# Altium footprint library LukaLIBRARY.PcbLib: 784 footprints (part 39 of 49)
Each footprint in its own frame and in the unit in brackets; x right, y up, seen from the top. Pads: shape width x height; smd on the part's side, far side on the other; paste and mask are expansions set on the pad; w line width, h text height; cw(c..) or ccw(c..) is an arc to the next point about the centre after c.
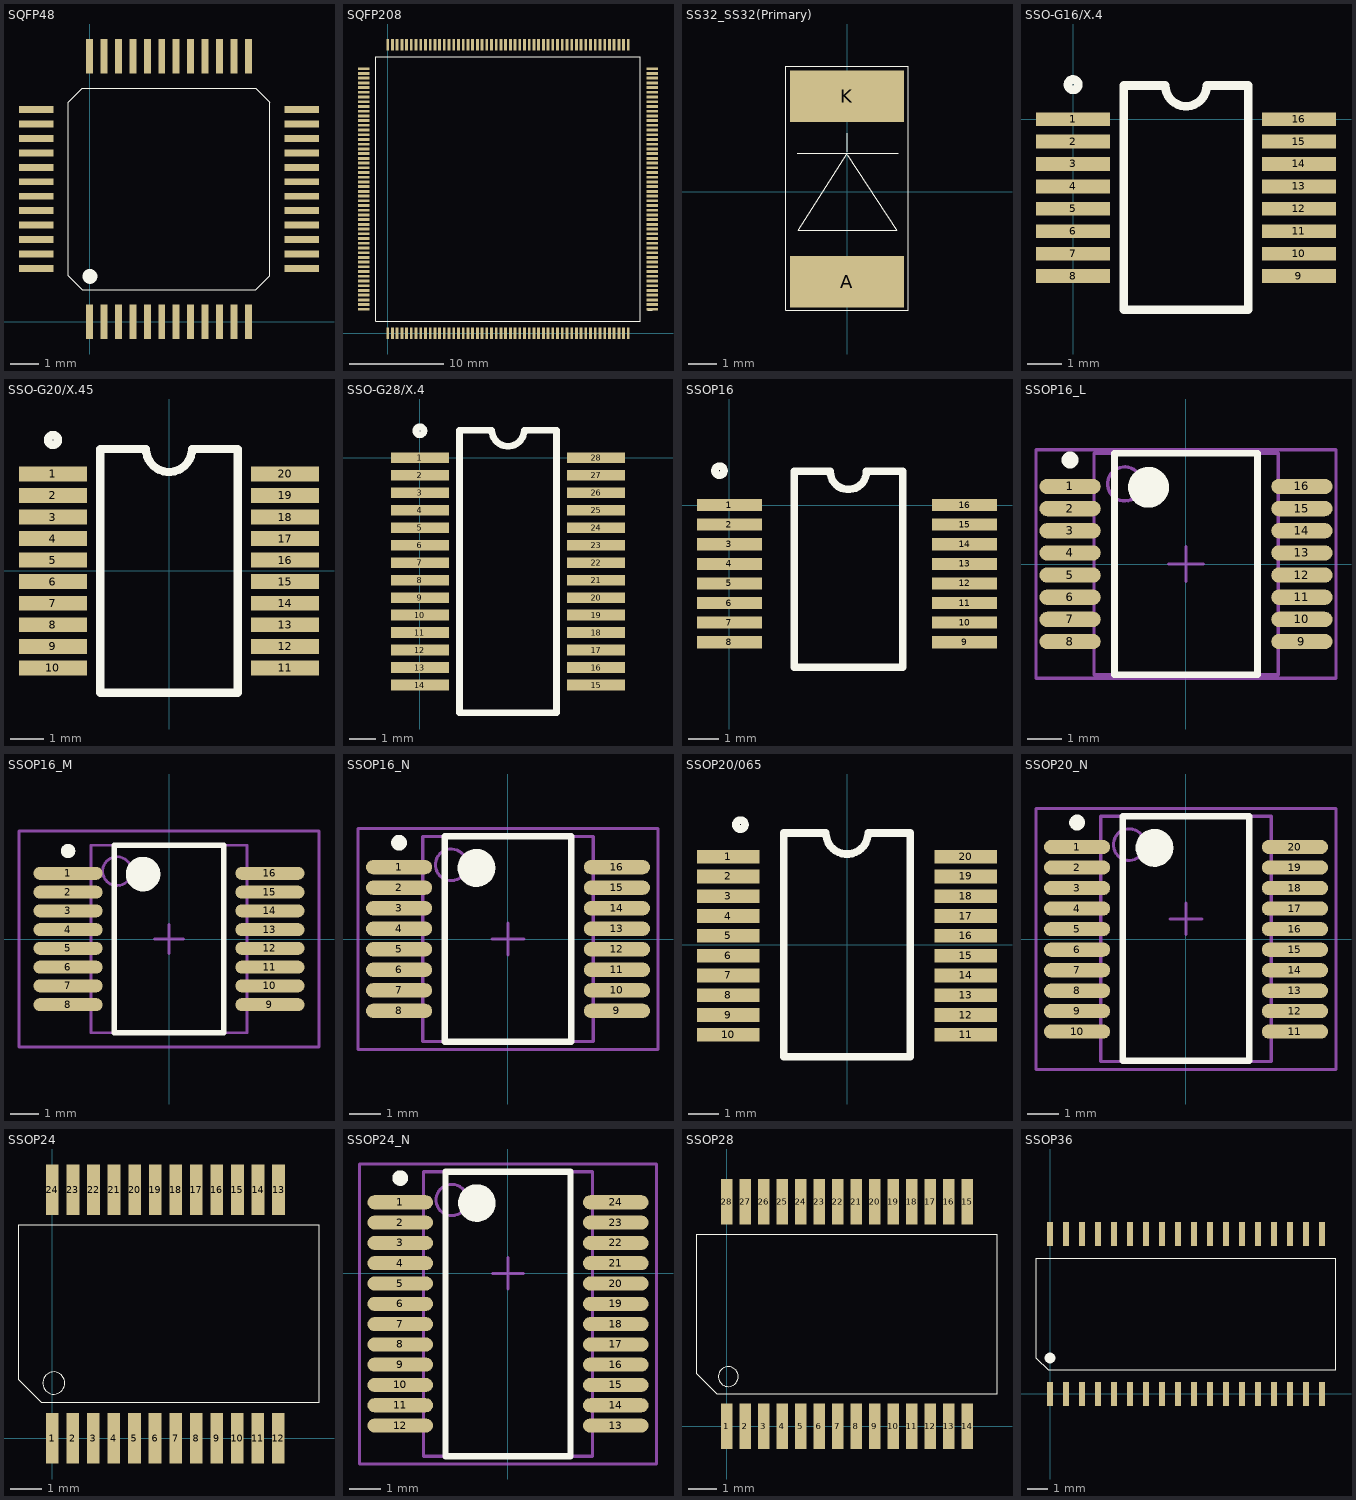
[diagram p38: the footprints below, top view; thin cyan lines are the x and y axes]

## SQFP48 [mm]
pads (48):
  rect 0.24x1.2 smd: 1(0,0) 2(0.5,0) 3(1,0) 4(1.5,0) 5(2,0) 6(2.5,0) 7(3,0) 8(3.5,0) 9(4,0) 10(4.5,0) 11(5,0) 12(5.5,0) 25(5.5,9.2) 26(5,9.2) 27(4.5,9.2) 28(4,9.2) 29(3.5,9.2) 30(3,9.2) 31(2.5,9.2) 32(2,9.2) 33(1.5,9.2) 34(1,9.2) 35(0.5,9.2) 36(0,9.2)
  rect 1.2x0.24 smd: 13(7.35,1.85) 14(7.35,2.35) 15(7.35,2.85) 16(7.35,3.35) 17(7.35,3.85) 18(7.35,4.35) 19(7.35,4.85) 20(7.35,5.35) 21(7.35,5.85) 22(7.35,6.35) 23(7.35,6.85) 24(7.35,7.35) 37(-1.85,7.35) 38(-1.85,6.85) 39(-1.85,6.35) 40(-1.85,5.85) 41(-1.85,5.35) 42(-1.85,4.85) 43(-1.85,4.35) 44(-1.85,3.85) 45(-1.85,3.35) 46(-1.85,2.85) 47(-1.85,2.35) 48(-1.85,1.85)
Top Overlay:
  circle w0.254: c0.01,1.57 r0.13
  lines w0.025: -0.75,1.6 -0.25,1.1 5.75,1.1 6.25,1.6 6.25,7.6 5.75,8.1 -0.25,8.1 -0.75,7.6 -0.75,1.6

## SQFP208 [mm]
pads (208):
  rect 0.3x1.2 smd: 1(0,0) 2(0.5,0) 3(1,0) 4(1.5,0) 5(2,0) 6(2.5,0) 7(3,0) 8(3.5,0) 9(4,0) 10(4.5,0) 11(5,0) 12(5.5,0) 13(6,0) 14(6.5,0) 15(7,0) 16(7.5,0) 17(8,0) 18(8.5,0) 19(9,0) 20(9.5,0) 21(10,0) 22(10.5,0) 23(11,0) 24(11.5,0) 25(12,0) 26(12.5,0) 27(13,0) 28(13.5,0) 29(14,0) 30(14.5,0) 31(15,0) 32(15.5,0) 33(16,0) 34(16.5,0) 35(17,0) 36(17.5,0) 37(18,0) 38(18.5,0) 39(19,0) 40(19.5,0) 41(20,0) 42(20.5,0) 43(21,0) 44(21.5,0) 45(22,0) 46(22.5,0) 47(23,0) 48(23.5,0) 49(24,0) 50(24.5,0) 51(25,0) 52(25.5,0) 105(25.5,30.6) 106(25,30.6) 107(24.5,30.6) 108(24,30.6) 109(23.5,30.6) 110(23,30.6) 111(22.5,30.6) 112(22,30.6) 113(21.5,30.6) 114(21,30.6) 115(20.5,30.6) 116(20,30.6) 117(19.5,30.6) 118(19,30.6) 119(18.5,30.6) 120(18,30.6) 121(17.5,30.6) 122(17,30.6) 123(16.5,30.6) 124(16,30.6) 125(15.5,30.6) 126(15,30.6) 127(14.5,30.6) 128(14,30.6) 129(13.5,30.6) 130(13,30.6) 131(12.5,30.6) 132(12,30.6) 133(11.5,30.6) 134(11,30.6) 135(10.5,30.6) 136(10,30.6) 137(9.5,30.6) 138(9,30.6) 139(8.5,30.6) 140(8,30.6) 141(7.5,30.6) 142(7,30.6) 143(6.5,30.6) 144(6,30.6) 145(5.5,30.6) 146(5,30.6) 147(4.5,30.6) 148(4,30.6) 149(3.5,30.6) 150(3,30.6) 151(2.5,30.6) 152(2,30.6) 153(1.5,30.6) 154(1,30.6) 155(0.5,30.6) 156(0,30.6)
  rect 1.2x0.3 smd: 53(28.05,2.55) 54(28.05,3.05) 55(28.05,3.55) 56(28.05,4.05) 57(28.05,4.55) 58(28.05,5.05) 59(28.05,5.55) 60(28.05,6.05) 61(28.05,6.55) 62(28.05,7.05) 63(28.05,7.55) 64(28.05,8.05) 65(28.05,8.55) 66(28.05,9.05) 67(28.05,9.55) 68(28.05,10.05) 69(28.05,10.55) 70(28.05,11.05) 71(28.05,11.55) 72(28.05,12.05) 73(28.05,12.55) 74(28.05,13.05) 75(28.05,13.55) 76(28.05,14.05) 77(28.05,14.55) 78(28.05,15.05) 79(28.05,15.55) 80(28.05,16.05) 81(28.05,16.55) 82(28.05,17.05) 83(28.05,17.55) 84(28.05,18.05) 85(28.05,18.55) 86(28.05,19.05) 87(28.05,19.55) 88(28.05,20.05) 89(28.05,20.55) 90(28.05,21.05) 91(28.05,21.55) 92(28.05,22.05) 93(28.05,22.55) 94(28.05,23.05) 95(28.05,23.55) 96(28.05,24.05) 97(28.05,24.55) 98(28.05,25.05) 99(28.05,25.55) 100(28.05,26.05) 101(28.05,26.55) 102(28.05,27.05) 103(28.05,27.55) 104(28.05,28.05) 157(-2.55,28.05) 158(-2.55,27.55) 159(-2.55,27.05) 160(-2.55,26.55) 161(-2.55,26.05) 162(-2.55,25.55) 163(-2.55,25.05) 164(-2.55,24.55) 165(-2.55,24.05) 166(-2.55,23.55) 167(-2.55,23.05) 168(-2.55,22.55) 169(-2.55,22.05) 170(-2.55,21.55) 171(-2.55,21.05) 172(-2.55,20.55) 173(-2.55,20.05) 174(-2.55,19.55) 175(-2.55,19.05) 176(-2.55,18.55) 177(-2.55,18.05) 178(-2.55,17.55) 179(-2.55,17.05) 180(-2.55,16.55) 181(-2.55,16.05) 182(-2.55,15.55) 183(-2.55,15.05) 184(-2.55,14.55) 185(-2.55,14.05) 186(-2.55,13.55) 187(-2.55,13.05) 188(-2.55,12.55) 189(-2.55,12.05) 190(-2.55,11.55) 191(-2.55,11.05) 192(-2.55,10.55) 193(-2.55,10.05) 194(-2.55,9.55) 195(-2.55,9.05) 196(-2.55,8.55) 197(-2.55,8.05) 198(-2.55,7.55) 199(-2.55,7.05) 200(-2.55,6.55) 201(-2.55,6.05) 202(-2.55,5.55) 203(-2.55,5.05) 204(-2.55,4.55) 205(-2.55,4.05) 206(-2.55,3.55) 207(-2.55,3.05) 208(-2.55,2.55)
Top Overlay:
  lines w0.025: 27.55,2.45 28.05,2.45 28.05,2.65 27.55,2.65 ; -1.25,1.3 -1.25,29.3 26.75,29.3 26.75,1.3 -1.25,1.3

## SS32_SS32(Primary) [mm]
pads (2):
  rect 4x1.8 smd mask-25.4: A(0,-3.15) K(0,3.35)
Top Overlay:
  lines w0.01: -2.15,4.25 -2.15,4.4 2.15,4.4 2.15,-4.15 -2.15,-4.15 -2.15,4.35 ; -1.75,1.35 1.8,1.35 ; 0,1.3 1.75,-1.35 -1.7,-1.35 0,1.35 ; 0,1.4 0,2.05
Top Solder:
  region: -2,2.45 2,2.45 2,4.25 -2,4.25
  region: -2,-4.05 2,-4.05 2,-2.25 -2,-2.25

## SSO-G16/X.4 [mm]
pads (16):
  rect 2.15x0.4 smd: 1(0,0) 2(0,-0.65) 3(0,-1.3) 4(0,-1.95) 5(0,-2.6) 6(0,-3.25) 7(0,-3.9) 8(0,-4.55) 9(6.55,-4.55) 10(6.55,-3.9) 11(6.55,-3.25) 12(6.55,-2.6) 13(6.55,-1.95) 14(6.55,-1.3) 15(6.55,-0.65) 16(6.55,0)
Top Overlay:
  circle w0.25: c0,1 r0.15
  lines w0.25: 1.475,-5.525 1.475,0.975 2.675,0.975 ccw(c3.275,0.975) 3.875,0.975 5.075,0.975 5.075,-5.525 1.475,-5.525

## SSO-G20/X.45 [mm]
pads (20):
  rect 2.05x0.45 smd: 1(-3.5,2.925) 2(-3.5,2.275) 3(-3.5,1.625) 4(-3.5,0.975) 5(-3.5,0.325) 6(-3.5,-0.325) 7(-3.5,-0.975) 8(-3.5,-1.625) 9(-3.5,-2.275) 10(-3.5,-2.925) 11(3.5,-2.925) 12(3.5,-2.275) 13(3.5,-1.625) 14(3.5,-0.975) 15(3.5,-0.325) 16(3.5,0.325) 17(3.5,0.975) 18(3.5,1.625) 19(3.5,2.275) 20(3.5,2.925)
Top Overlay:
  circle w0.25: c-3.5,3.95 r0.15
  lines w0.25: -2.075,-3.675 -2.075,3.675 -0.692,3.675 ccw(c0,3.675) 0.692,3.675 2.075,3.675 2.075,-3.675 -2.075,-3.675

## SSO-G28/X.4 [mm]
pads (28):
  rect 2.15x0.4 smd: 1(0,0) 2(0,-0.65) 3(0,-1.3) 4(0,-1.95) 5(0,-2.6) 6(0,-3.25) 7(0,-3.9) 8(0,-4.55) 9(0,-5.2) 10(0,-5.85) 11(0,-6.5) 12(0,-7.15) 13(0,-7.8) 14(0,-8.45) 15(6.55,-8.45) 16(6.55,-7.8) 17(6.55,-7.15) 18(6.55,-6.5) 19(6.55,-5.85) 20(6.55,-5.2) 21(6.55,-4.55) 22(6.55,-3.9) 23(6.55,-3.25) 24(6.55,-2.6) 25(6.55,-1.95) 26(6.55,-1.3) 27(6.55,-0.65) 28(6.55,0)
Top Overlay:
  circle w0.25: c0,1 r0.15
  lines w0.25: 1.475,-9.475 1.475,1.025 2.675,1.025 ccw(c3.275,1.025) 3.875,1.025 5.075,1.025 5.075,-9.475 1.475,-9.475

## SSOP16 [mm]
pads (16):
  rect 2.15x0.4 smd: 1(0,0) 2(0,-0.65) 3(0,-1.3) 4(0,-1.95) 5(0,-2.6) 6(0,-3.25) 7(0,-3.9) 8(0,-4.55) 9(7.8,-4.55) 10(7.8,-3.9) 11(7.8,-3.25) 12(7.8,-2.6) 13(7.8,-1.95) 14(7.8,-1.3) 15(7.8,-0.65) 16(7.8,0)
Top Overlay:
  circle w0.25: c-0.33,1.14 r0.15
  lines w0.25: 2.145,-5.385 5.745,-5.385 5.745,1.115 4.545,1.115 cw(c3.945,1.115) 3.345,1.115 2.145,1.115 2.145,-5.385

## SSOP16_L [mm] "SOP, 16-Leads, Body 6.2x5.3mm, Pitch 0.65mm, IPC High Density"
height 2
pads (16):
  oval 1.8x0.45 smd: 1(-3.4,2.275) 2(-3.4,1.625) 3(-3.4,0.975) 4(-3.4,0.325) 5(-3.4,-0.325) 6(-3.4,-0.975) 7(-3.4,-1.625) 8(-3.4,-2.275) 9(3.4,-2.275) 10(3.4,-1.625) 11(3.4,-0.975) 12(3.4,-0.325) 13(3.4,0.325) 14(3.4,0.975) 15(3.4,1.625) 16(3.4,2.275)
Top Overlay:
  circle w0.25: c-3.4,3.05 r0.125
  circle w0.6: c-1.1,2.25 r0.3
  lines w0.2: -2.1,-3.25 -2.1,3.25 2.1,3.25 2.1,-3.25 -2.1,-3.25
Mechanical 13:
  circle w0.1: c-1.8,2.35 r0.5
  lines w0.1: -2.7,-3.25 -2.7,3.25 2.7,3.25 2.7,-3.25 -2.7,-3.25
Mechanical 15:
  lines w0.1: -0.5,0 0.5,0 ; 0,-0.5 0,0.5 ; -4.4,-3.35 -4.4,3.35 4.4,3.35 4.4,-3.35 -4.4,-3.35
3D body: height 2, standoff 0, extent -2.7,-3.25 2.7,3.25

## SSOP16_M [mm] "SOP, 16-Leads, Body 6.2x5.3mm, Pitch 0.65mm, IPC Low Density"
height 2
pads (16):
  oval 2.4x0.45 smd: 1(-3.5,2.275) 2(-3.5,1.625) 3(-3.5,0.975) 4(-3.5,0.325) 5(-3.5,-0.325) 6(-3.5,-0.975) 7(-3.5,-1.625) 8(-3.5,-2.275) 9(3.5,-2.275) 10(3.5,-1.625) 11(3.5,-0.975) 12(3.5,-0.325) 13(3.5,0.325) 14(3.5,0.975) 15(3.5,1.625) 16(3.5,2.275)
Top Overlay:
  circle w0.6: c-0.9,2.25 r0.3
  circle w0.25: c-3.5,3.05 r0.125
  lines w0.2: -1.9,-3.25 1.9,-3.25 1.9,3.25 -1.9,3.25 -1.9,-3.25
Mechanical 13:
  circle w0.1: c-1.8,2.35 r0.5
  lines w0.1: -2.7,-3.25 2.7,-3.25 2.7,3.25 -2.7,3.25 -2.7,-3.25
Mechanical 15:
  lines w0.1: -0.5,0 0.5,0 ; 0,-0.5 0,0.5 ; -5.2,-3.75 5.2,-3.75 5.2,3.75 -5.2,3.75 -5.2,-3.75
3D body: height 2, standoff 0, extent -2.7,-3.25 2.7,3.25

## SSOP16_N [mm] "SOP, 16-Leads, Body 6.2x5.3mm, Pitch 0.65mm, IPC Medium Density"
height 2
pads (16):
  oval 2.1x0.45 smd: 1(-3.45,2.275) 2(-3.45,1.625) 3(-3.45,0.975) 4(-3.45,0.325) 5(-3.45,-0.325) 6(-3.45,-0.975) 7(-3.45,-1.625) 8(-3.45,-2.275) 9(3.45,-2.275) 10(3.45,-1.625) 11(3.45,-0.975) 12(3.45,-0.325) 13(3.45,0.325) 14(3.45,0.975) 15(3.45,1.625) 16(3.45,2.275)
Top Overlay:
  circle w0.25: c-3.45,3.05 r0.125
  circle w0.6: c-1,2.25 r0.3
  lines w0.2: -2,-3.25 -2,3.25 2,3.25 2,-3.25 -2,-3.25
Mechanical 13:
  circle w0.1: c-1.8,2.35 r0.5
  lines w0.1: -2.7,-3.25 -2.7,3.25 2.7,3.25 2.7,-3.25 -2.7,-3.25
Mechanical 15:
  lines w0.1: -0.5,0 0.5,0 ; 0,-0.5 0,0.5 ; -4.75,-3.5 -4.75,3.5 4.75,3.5 4.75,-3.5 -4.75,-3.5
3D body: height 2, standoff 0, extent -2.7,-3.25 2.7,3.25

## SSOP20/065 [mm]
pads (20):
  rect 2.05x0.45 smd: 1(-3.9,2.9) 2(-3.9,2.25) 3(-3.9,1.6) 4(-3.9,0.95) 5(-3.9,0.3) 6(-3.9,-0.35) 7(-3.9,-1) 8(-3.9,-1.65) 9(-3.9,-2.3) 10(-3.9,-2.95) 11(3.9,-2.95) 12(3.9,-2.3) 13(3.9,-1.65) 14(3.9,-1) 15(3.9,-0.35) 16(3.9,0.3) 17(3.9,0.95) 18(3.9,1.6) 19(3.9,2.25) 20(3.9,2.9)
Top Overlay:
  circle w0.25: c-3.5,3.95 r0.15
  lines w0.25: -2.075,-3.675 -2.075,3.675 -0.692,3.675 ccw(c0,3.675) 0.692,3.675 2.075,3.675 2.075,-3.675 -2.075,-3.675

## SSOP20_N [mm]
pads (20):
  oval 2.1x0.45 smd: 1(-3.45,2.923) 2(-3.45,2.272) 3(-3.45,1.623) 4(-3.45,0.972) 5(-3.45,0.323) 6(-3.45,-0.327) 7(-3.45,-0.977) 8(-3.45,-1.627) 9(-3.45,-2.272) 10(-3.45,-2.923) 11(3.45,-2.923) 12(3.45,-2.272) 13(3.45,-1.627) 14(3.45,-0.977) 15(3.45,-0.327) 16(3.45,0.323) 17(3.45,0.972) 18(3.45,1.623) 19(3.45,2.272) 20(3.45,2.923)
Top Overlay:
  circle w0.6: c-1,2.897 r0.3
  circle w0.25: c-3.45,3.698 r0.125
  lines w0.2: -2,-3.848 2,-3.848 2,3.898 -2,3.898 -2,-3.848
Mechanical 13:
  circle w0.1: c-1.8,2.998 r0.5
  lines w0.1: -2.7,-3.874 2.7,-3.874 2.7,3.898 -2.7,3.898 -2.7,-3.874
Mechanical 15:
  lines w0.1: -0.5,0.648 0.5,0.648 ; 0,0.148 0,1.148 ; -4.75,-4.128 4.75,-4.128 4.75,4.147 -4.75,4.147 -4.75,-4.128
3D body: height 2, standoff 0, extent -2.7,-3.874 2.7,3.898

## SSOP24 [mm]
pads (24):
  rect 0.4x1.6 smd mask-25.4: 1(0,0) 2(0.65,0) 3(1.3,0) 4(1.95,0) 5(2.6,0) 6(3.25,0) 7(3.9,0) 8(4.55,0) 9(5.2,0) 10(5.85,0) 11(6.5,0) 12(7.15,0) 13(7.155,7.865) 14(6.505,7.865) 15(5.855,7.865) 16(5.205,7.865) 17(4.555,7.865) 18(3.905,7.865) 19(3.255,7.865) 20(2.605,7.865) 21(1.955,7.865) 22(1.305,7.865) 23(0.655,7.865) 24(0.005,7.865)
Top Overlay:
  circle w0.025: c0.05,1.75 r0.35
  lines w0.025: -1.05,1.85 -1.05,6.75 8.433,6.756 8.433,1.143 -0.35,1.15 -1.05,1.85
Top Solder:
  region: 5.005,7.065 5.405,7.065 5.405,8.665 5.005,8.665
  region: 5,-0.8 5.4,-0.8 5.4,0.8 5,0.8
  region: 6.955,7.065 7.355,7.065 7.355,8.665 6.955,8.665
  region: 6.305,7.065 6.705,7.065 6.705,8.665 6.305,8.665
  region: 5.655,7.065 6.055,7.065 6.055,8.665 5.655,8.665
  region: 6.95,-0.8 7.35,-0.8 7.35,0.8 6.95,0.8
  region: 6.3,-0.8 6.7,-0.8 6.7,0.8 6.3,0.8
  region: 5.65,-0.8 6.05,-0.8 6.05,0.8 5.65,0.8
  region: 4.355,7.065 4.755,7.065 4.755,8.665 4.355,8.665
  region: 3.705,7.065 4.105,7.065 4.105,8.665 3.705,8.665
  region: 3.055,7.065 3.455,7.065 3.455,8.665 3.055,8.665
  region: 2.405,7.065 2.805,7.065 2.805,8.665 2.405,8.665
  region: 1.755,7.065 2.155,7.065 2.155,8.665 1.755,8.665
  region: 1.105,7.065 1.505,7.065 1.505,8.665 1.105,8.665
  region: 0.455,7.065 0.855,7.065 0.855,8.665 0.455,8.665
  region: -0.195,7.065 0.205,7.065 0.205,8.665 -0.195,8.665
  region: 2.4,-0.8 2.8,-0.8 2.8,0.8 2.4,0.8
  region: 4.35,-0.8 4.75,-0.8 4.75,0.8 4.35,0.8
  region: 3.7,-0.8 4.1,-0.8 4.1,0.8 3.7,0.8
  region: 3.05,-0.8 3.45,-0.8 3.45,0.8 3.05,0.8
  region: 1.75,-0.8 2.15,-0.8 2.15,0.8 1.75,0.8
  region: 1.1,-0.8 1.5,-0.8 1.5,0.8 1.1,0.8
  region: 0.45,-0.8 0.85,-0.8 0.85,0.8 0.45,0.8
  region: -0.2,-0.8 0.2,-0.8 0.2,0.8 -0.2,0.8

## SSOP24_N [mm] "SOP, 24-Leads, Body 6.2x5.3mm, Pitch 0.65mm, IPC Medium Density"
height 2
pads (24):
  oval 2.1x0.45 smd: 1(-3.45,2.275) 2(-3.45,1.625) 3(-3.45,0.975) 4(-3.45,0.325) 5(-3.45,-0.325) 6(-3.45,-0.975) 7(-3.45,-1.625) 8(-3.45,-2.275) 9(-3.45,-2.92) 10(-3.45,-3.57) 11(-3.45,-4.22) 12(-3.45,-4.87) 13(3.45,-4.87) 14(3.45,-4.22) 15(3.45,-3.57) 16(3.45,-2.92) 17(3.45,-2.275) 18(3.45,-1.625) 19(3.45,-0.975) 20(3.45,-0.325) 21(3.45,0.325) 22(3.45,0.975) 23(3.45,1.625) 24(3.45,2.275)
Top Overlay:
  circle w0.25: c-3.45,3.05 r0.125
  circle w0.6: c-1,2.25 r0.3
  lines w0.2: -2,-5.85 -2,3.25 2,3.25 2,-5.85 -2,-5.85
Mechanical 13:
  circle w0.1: c-1.8,2.35 r0.5
  lines w0.1: -2.7,-5.85 -2.7,3.25 2.7,3.25 2.7,-5.85 -2.7,-5.85
Mechanical 15:
  lines w0.1: -0.5,0 0.5,0 ; 0,-0.5 0,0.5 ; -4.75,-6.1 -4.75,3.5 4.75,3.5 4.75,-6.1 -4.75,-6.1
3D body: height 2, standoff 0, extent -2.7,-5.85 2.7,3.25

## SSOP28 [mm]
pads (28):
  rect 0.4x1.6 smd mask-25.4: 1(0,0) 2(0.65,0) 3(1.3,0) 4(1.95,0) 5(2.6,0) 6(3.25,0) 7(3.9,0) 8(4.55,0) 9(5.2,0) 10(5.85,0) 11(6.5,0) 12(7.15,0) 13(7.8,0) 14(8.45,0) 15(8.45,7.9) 16(7.8,7.9) 17(7.15,7.9) 18(6.5,7.9) 19(5.85,7.9) 20(5.2,7.9) 21(4.55,7.9) 22(3.9,7.9) 23(3.25,7.9) 24(2.6,7.9) 25(1.95,7.9) 26(1.3,7.9) 27(0.65,7.9) 28(0,7.9)
Top Overlay:
  circle w0.025: c0.05,1.75 r0.35
  lines w0.025: -1.05,1.85 -0.35,1.15 9.5,1.15 9.5,6.75 -1.05,6.75 -1.05,1.85
Top Solder:
  region: -0.2,-0.8 0.2,-0.8 0.2,0.8 -0.2,0.8
  region: 0.45,-0.8 0.85,-0.8 0.85,0.8 0.45,0.8
  region: 1.1,-0.8 1.5,-0.8 1.5,0.8 1.1,0.8
  region: 1.75,-0.8 2.15,-0.8 2.15,0.8 1.75,0.8
  region: 3.05,-0.8 3.45,-0.8 3.45,0.8 3.05,0.8
  region: 3.7,-0.8 4.1,-0.8 4.1,0.8 3.7,0.8
  region: 4.35,-0.8 4.75,-0.8 4.75,0.8 4.35,0.8
  region: 2.4,-0.8 2.8,-0.8 2.8,0.8 2.4,0.8
  region: 1.75,7.1 2.15,7.1 2.15,8.7 1.75,8.7
  region: 1.1,7.1 1.5,7.1 1.5,8.7 1.1,8.7
  region: 0.45,7.1 0.85,7.1 0.85,8.7 0.45,8.7
  region: 4.35,7.1 4.75,7.1 4.75,8.7 4.35,8.7
  region: 3.7,7.1 4.1,7.1 4.1,8.7 3.7,8.7
  region: 3.05,7.1 3.45,7.1 3.45,8.7 3.05,8.7
  region: 2.4,7.1 2.8,7.1 2.8,8.7 2.4,8.7
  region: -0.2,7.1 0.2,7.1 0.2,8.7 -0.2,8.7
  region: 5.65,-0.8 6.05,-0.8 6.05,0.8 5.65,0.8
  region: 6.3,-0.8 6.7,-0.8 6.7,0.8 6.3,0.8
  region: 6.95,-0.8 7.35,-0.8 7.35,0.8 6.95,0.8
  region: 7.6,-0.8 8,-0.8 8,0.8 7.6,0.8
  region: 8.25,-0.8 8.65,-0.8 8.65,0.8 8.25,0.8
  region: 8.25,7.1 8.65,7.1 8.65,8.7 8.25,8.7
  region: 7.6,7.1 8,7.1 8,8.7 7.6,8.7
  region: 6.95,7.1 7.35,7.1 7.35,8.7 6.95,8.7
  region: 6.3,7.1 6.7,7.1 6.7,8.7 6.3,8.7
  region: 5.65,7.1 6.05,7.1 6.05,8.7 5.65,8.7
  region: 5,-0.8 5.4,-0.8 5.4,0.8 5,0.8
  region: 5,7.1 5.4,7.1 5.4,8.7 5,8.7

## SSOP36 [mm]
pads (36):
  rect 0.32x1.2 smd mask-25.4: 1(0,0) 2(0.8,0) 3(1.6,0) 4(2.4,0) 5(3.2,0) 6(4,0) 7(4.8,0) 8(5.6,0) 9(6.4,0) 10(7.2,0) 11(8,0) 12(8.8,0) 13(9.6,0) 14(10.4,0) 15(11.2,0) 16(12,0) 17(12.8,0) 18(13.6,0) 19(13.6,8) 20(12.8,8) 21(12,8) 22(11.2,8) 23(10.4,8) 24(9.6,8) 25(8.8,8) 26(8,8) 27(7.2,8) 28(6.4,8) 29(5.6,8) 30(4.8,8) 31(4,8) 32(3.2,8) 33(2.4,8) 34(1.6,8) 35(0.8,8) 36(0,8)
Top Overlay:
  circle w0.254: c0,1.8 r0.14
  lines w0.025: -0.7,1.8 -0.7,6.8 14.3,6.8 14.3,1.2 -0.1,1.2 -0.7,1.8
Top Solder:
  region: -0.16,7.4 0.16,7.4 0.16,8.6 -0.16,8.6
  region: -0.16,-0.6 0.16,-0.6 0.16,0.6 -0.16,0.6
  region: 7.84,7.4 8.16,7.4 8.16,8.6 7.84,8.6
  region: 8.64,7.4 8.96,7.4 8.96,8.6 8.64,8.6
  region: 9.44,7.4 9.76,7.4 9.76,8.6 9.44,8.6
  region: 10.24,7.4 10.56,7.4 10.56,8.6 10.24,8.6
  region: 11.04,7.4 11.36,7.4 11.36,8.6 11.04,8.6
  region: 11.84,7.4 12.16,7.4 12.16,8.6 11.84,8.6
  region: 12.64,7.4 12.96,7.4 12.96,8.6 12.64,8.6
  region: 13.44,7.4 13.76,7.4 13.76,8.6 13.44,8.6
  region: 13.44,-0.6 13.76,-0.6 13.76,0.6 13.44,0.6
  region: 12.64,-0.6 12.96,-0.6 12.96,0.6 12.64,0.6
  region: 11.84,-0.6 12.16,-0.6 12.16,0.6 11.84,0.6
  region: 11.04,-0.6 11.36,-0.6 11.36,0.6 11.04,0.6
  region: 10.24,-0.6 10.56,-0.6 10.56,0.6 10.24,0.6
  region: 9.44,-0.6 9.76,-0.6 9.76,0.6 9.44,0.6
  region: 8.64,-0.6 8.96,-0.6 8.96,0.6 8.64,0.6
  region: 7.84,-0.6 8.16,-0.6 8.16,0.6 7.84,0.6
  region: 0.64,7.4 0.96,7.4 0.96,8.6 0.64,8.6
  region: 1.44,7.4 1.76,7.4 1.76,8.6 1.44,8.6
  region: 2.24,7.4 2.56,7.4 2.56,8.6 2.24,8.6
  region: 3.04,7.4 3.36,7.4 3.36,8.6 3.04,8.6
  region: 3.84,7.4 4.16,7.4 4.16,8.6 3.84,8.6
  region: 4.64,7.4 4.96,7.4 4.96,8.6 4.64,8.6
  region: 5.44,7.4 5.76,7.4 5.76,8.6 5.44,8.6
  region: 6.24,7.4 6.56,7.4 6.56,8.6 6.24,8.6
  region: 7.04,7.4 7.36,7.4 7.36,8.6 7.04,8.6
  region: 7.04,-0.6 7.36,-0.6 7.36,0.6 7.04,0.6
  region: 6.24,-0.6 6.56,-0.6 6.56,0.6 6.24,0.6
  region: 5.44,-0.6 5.76,-0.6 5.76,0.6 5.44,0.6
  region: 4.64,-0.6 4.96,-0.6 4.96,0.6 4.64,0.6
  region: 3.84,-0.6 4.16,-0.6 4.16,0.6 3.84,0.6
  region: 3.04,-0.6 3.36,-0.6 3.36,0.6 3.04,0.6
  region: 2.24,-0.6 2.56,-0.6 2.56,0.6 2.24,0.6
  region: 1.44,-0.6 1.76,-0.6 1.76,0.6 1.44,0.6
  region: 0.64,-0.6 0.96,-0.6 0.96,0.6 0.64,0.6